# Altium integrated library Weidmueller_OMNIMATE_Signal.IntLib: 2550 symbols (part 3 of 45) (continued)
## 1032990000 (continued)
OMNIMATE Signal - series BC/SC 3.81; PartNumber: 1032990000; Manufacturer: Weidmueller; Short_text_for_material: SCDV 3.81/16/90F 3.2SN BK BX; Side_termination_characteristic: Flange; Mounting_onto_the_PCB: Solder connection; Pitch_mm: 3.81 mm; Pitch_inch: 0.15 inch; No_of_poles: 16; Outgoing_elbow: 90°; Solder_pin_length_mm: 3.2 mm; Contact_surface: tinned; Insulating_material: PA GF; UL_94_flammability_rating: V-0; Rated_voltage_for_surge_voltage_class_pollution_degree_II_2: 320 V; Rated_current_min_no_of_poles_TU_20_deg_C: 17.5 A; Rated_voltage_use_group_B_UL_1059: 300 V; Rated_current_use_group_B_UL_1059: 10 A; PackageReference: SCDV_3_81_90F_16; Colour: Black; Packaging: Box; Qty: 50 PCS; Revision: V1; ComponentLink1Description: Manufacturer URL; ComponentLink1URL: http://www.weidmueller.com/; ComponentLink2Description: URL Link1; ComponentLink2URL: http://catalog.weidmueller.com/catalog/Start.do?localeId=en&ObjectID=1032990000
footprint SCDV_3_81_90F_16 (OMNIMATE Signal - Serie BC/SC 3.81  SCDV 3.81/16/90F 3.2)
part A pins: A1, A2, A3, A4, A5, A6, A7, A8
part B pins: B1, B2, B3, B4, B5, B6, B7, B8

## 1032990000_Single
designator J?
OMNIMATE Signal - series BC/SC 3.81; PartNumber: 1032990000; Manufacturer: Weidmueller; Short_text_for_material: SCDV 3.81/16/90F 3.2SN BK BX; Side_termination_characteristic: Flange; Mounting_onto_the_PCB: Solder connection; Pitch_mm: 3.81 mm; Pitch_inch: 0.15 inch; No_of_poles: 16; Outgoing_elbow: 90°; Solder_pin_length_mm: 3.2 mm; Contact_surface: tinned; Insulating_material: PA GF; UL_94_flammability_rating: V-0; Rated_voltage_for_surge_voltage_class_pollution_degree_II_2: 320 V; Rated_current_min_no_of_poles_TU_20_deg_C: 17.5 A; Rated_voltage_use_group_B_UL_1059: 300 V; Rated_current_use_group_B_UL_1059: 10 A; PackageReference: SCDV_3_81_90F_16; Colour: Black; Packaging: Box; Qty: 50 PCS; Revision: V1; ComponentLink1Description: Manufacturer URL; ComponentLink1URL: http://www.weidmueller.com/; ComponentLink2Description: URL Link1; ComponentLink2URL: http://catalog.weidmueller.com/catalog/Start.do?localeId=en&ObjectID=1032990000
footprint SCDV_3_81_90F_16 (OMNIMATE Signal - Serie BC/SC 3.81  SCDV 3.81/16/90F 3.2)
part A pins: A1
part B pins: A2
part C pins: A3
part D pins: A4
part E pins: A5
part F pins: A6
part G pins: A7
part H pins: A8
part I pins: B1
part J pins: B2
part K pins: B3
part L pins: B4
part M pins: B5
part N pins: B6
part O pins: B7
part P pins: B8

## 1033490000
designator J?
OMNIMATE Signal - series BC/SC 3.81; PartNumber: 1033490000; Manufacturer: Weidmueller; Short_text_for_material: SCDV-THR 3.81/04/90G 3.2SN BK BX; Side_termination_characteristic: closed side; Mounting_onto_the_PCB: Reflow solder connection; Pitch_mm: 3.81 mm; Pitch_inch: 0.15 inch; No_of_poles: 4; Outgoing_elbow: 90°; Solder_pin_length_mm: 3.2 mm; Contact_material: Cu-Leg; Contact_surface: tinned; Insulating_material: LCP GF; UL_94_flammability_rating: V-0; Rated_voltage_for_surge_voltage_class_pollution_degree_II_2: 320 V; Rated_voltage_use_group_B_UL_1059: 300 V; Rated_current_use_group_B_UL_1059: 10 A; PackageReference: SCDV_THR_3_81_90G_04; Colour: Black; Packaging: Box; Qty: 50 PCS; Revision: V1; ComponentLink1Description: Manufacturer URL; ComponentLink1URL: http://www.weidmueller.com/; ComponentLink2Description: URL Link1; ComponentLink2URL: http://catalog.weidmueller.com/catalog/Start.do?localeId=en&ObjectID=1033490000
footprint SCDV_THR_3_81_90G_04 (OMNIMATE Signal - Serie BC/SC 3.81  SCDV-THR 3.81/04/90G 3.2)
part A pins: A1, A2
part B pins: B1, B2

## 1033490000_Single
designator J?
OMNIMATE Signal - series BC/SC 3.81; PartNumber: 1033490000; Manufacturer: Weidmueller; Short_text_for_material: SCDV-THR 3.81/04/90G 3.2SN BK BX; Side_termination_characteristic: closed side; Mounting_onto_the_PCB: Reflow solder connection; Pitch_mm: 3.81 mm; Pitch_inch: 0.15 inch; No_of_poles: 4; Outgoing_elbow: 90°; Solder_pin_length_mm: 3.2 mm; Contact_material: Cu-Leg; Contact_surface: tinned; Insulating_material: LCP GF; UL_94_flammability_rating: V-0; Rated_voltage_for_surge_voltage_class_pollution_degree_II_2: 320 V; Rated_voltage_use_group_B_UL_1059: 300 V; Rated_current_use_group_B_UL_1059: 10 A; PackageReference: SCDV_THR_3_81_90G_04; Colour: Black; Packaging: Box; Qty: 50 PCS; Revision: V1; ComponentLink1Description: Manufacturer URL; ComponentLink1URL: http://www.weidmueller.com/; ComponentLink2Description: URL Link1; ComponentLink2URL: http://catalog.weidmueller.com/catalog/Start.do?localeId=en&ObjectID=1033490000
footprint SCDV_THR_3_81_90G_04 (OMNIMATE Signal - Serie BC/SC 3.81  SCDV-THR 3.81/04/90G 3.2)
part A pins: A1
part B pins: A2
part C pins: B1
part D pins: B2

## 1033510000
designator J?
OMNIMATE Signal - series BC/SC 3.81; PartNumber: 1033510000; Manufacturer: Weidmueller; Short_text_for_material: SCDV-THR 3.81/06/90G 3.2SN BK BX; Side_termination_characteristic: closed side; Mounting_onto_the_PCB: Reflow solder connection; Pitch_mm: 3.81 mm; Pitch_inch: 0.15 inch; No_of_poles: 6; Outgoing_elbow: 90°; Solder_pin_length_mm: 3.2 mm; Contact_material: Cu-Leg; Contact_surface: tinned; Insulating_material: LCP GF; UL_94_flammability_rating: V-0; Rated_voltage_for_surge_voltage_class_pollution_degree_II_2: 320 V; Rated_voltage_use_group_B_UL_1059: 300 V; Rated_current_use_group_B_UL_1059: 10 A; PackageReference: SCDV_THR_3_81_90G_06; Colour: Black; Packaging: Box; Qty: 50 PCS; Revision: V1; ComponentLink1Description: Manufacturer URL; ComponentLink1URL: http://www.weidmueller.com/; ComponentLink2Description: URL Link1; ComponentLink2URL: http://catalog.weidmueller.com/catalog/Start.do?localeId=en&ObjectID=1033510000
footprint SCDV_THR_3_81_90G_06 (OMNIMATE Signal - Serie BC/SC 3.81  SCDV-THR 3.81/06/90G 3.2)
part A pins: A1, A2, A3
part B pins: B1, B2, B3

## 1033510000_Single
designator J?
OMNIMATE Signal - series BC/SC 3.81; PartNumber: 1033510000; Manufacturer: Weidmueller; Short_text_for_material: SCDV-THR 3.81/06/90G 3.2SN BK BX; Side_termination_characteristic: closed side; Mounting_onto_the_PCB: Reflow solder connection; Pitch_mm: 3.81 mm; Pitch_inch: 0.15 inch; No_of_poles: 6; Outgoing_elbow: 90°; Solder_pin_length_mm: 3.2 mm; Contact_material: Cu-Leg; Contact_surface: tinned; Insulating_material: LCP GF; UL_94_flammability_rating: V-0; Rated_voltage_for_surge_voltage_class_pollution_degree_II_2: 320 V; Rated_voltage_use_group_B_UL_1059: 300 V; Rated_current_use_group_B_UL_1059: 10 A; PackageReference: SCDV_THR_3_81_90G_06; Colour: Black; Packaging: Box; Qty: 50 PCS; Revision: V1; ComponentLink1Description: Manufacturer URL; ComponentLink1URL: http://www.weidmueller.com/; ComponentLink2Description: URL Link1; ComponentLink2URL: http://catalog.weidmueller.com/catalog/Start.do?localeId=en&ObjectID=1033510000
footprint SCDV_THR_3_81_90G_06 (OMNIMATE Signal - Serie BC/SC 3.81  SCDV-THR 3.81/06/90G 3.2)
part A pins: A1
part B pins: A2
part C pins: A3
part D pins: B1
part E pins: B2
part F pins: B3

## 1033520000
designator J?
OMNIMATE Signal - series BC/SC 3.81; PartNumber: 1033520000; Manufacturer: Weidmueller; Short_text_for_material: SCDV-THR 3.81/08/90G 3.2SN BK BX; Side_termination_characteristic: closed side; Mounting_onto_the_PCB: Reflow solder connection; Pitch_mm: 3.81 mm; Pitch_inch: 0.15 inch; No_of_poles: 8; Outgoing_elbow: 90°; Solder_pin_length_mm: 3.2 mm; Contact_material: Cu-Leg; Contact_surface: tinned; Insulating_material: LCP GF; UL_94_flammability_rating: V-0; Rated_voltage_for_surge_voltage_class_pollution_degree_II_2: 320 V; Rated_voltage_use_group_B_UL_1059: 300 V; Rated_current_use_group_B_UL_1059: 10 A; PackageReference: SCDV_THR_3_81_90G_08; Colour: Black; Packaging: Box; Qty: 50 PCS; Revision: V1; ComponentLink1Description: Manufacturer URL; ComponentLink1URL: http://www.weidmueller.com/; ComponentLink2Description: URL Link1; ComponentLink2URL: http://catalog.weidmueller.com/catalog/Start.do?localeId=en&ObjectID=1033520000
footprint SCDV_THR_3_81_90G_08 (OMNIMATE Signal - Serie BC/SC 3.81  SCDV-THR 3.81/08/90G 3.2)
part A pins: A1, A2, A3, A4
part B pins: B1, B2, B3, B4

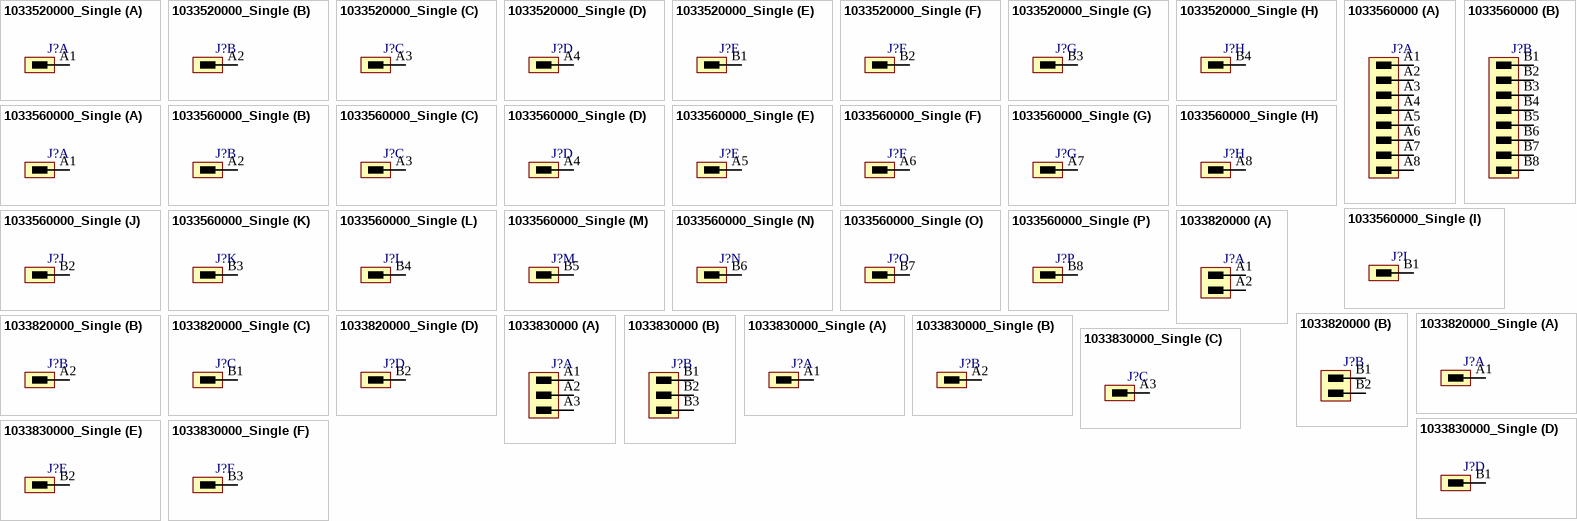
[diagram p16: symbols 1033520000_Single to 1033830000_Single]

## 1033520000_Single
designator J?
OMNIMATE Signal - series BC/SC 3.81; PartNumber: 1033520000; Manufacturer: Weidmueller; Short_text_for_material: SCDV-THR 3.81/08/90G 3.2SN BK BX; Side_termination_characteristic: closed side; Mounting_onto_the_PCB: Reflow solder connection; Pitch_mm: 3.81 mm; Pitch_inch: 0.15 inch; No_of_poles: 8; Outgoing_elbow: 90°; Solder_pin_length_mm: 3.2 mm; Contact_material: Cu-Leg; Contact_surface: tinned; Insulating_material: LCP GF; UL_94_flammability_rating: V-0; Rated_voltage_for_surge_voltage_class_pollution_degree_II_2: 320 V; Rated_voltage_use_group_B_UL_1059: 300 V; Rated_current_use_group_B_UL_1059: 10 A; PackageReference: SCDV_THR_3_81_90G_08; Colour: Black; Packaging: Box; Qty: 50 PCS; Revision: V1; ComponentLink1Description: Manufacturer URL; ComponentLink1URL: http://www.weidmueller.com/; ComponentLink2Description: URL Link1; ComponentLink2URL: http://catalog.weidmueller.com/catalog/Start.do?localeId=en&ObjectID=1033520000
footprint SCDV_THR_3_81_90G_08 (OMNIMATE Signal - Serie BC/SC 3.81  SCDV-THR 3.81/08/90G 3.2)
part A pins: A1
part B pins: A2
part C pins: A3
part D pins: A4
part E pins: B1
part F pins: B2
part G pins: B3
part H pins: B4

## 1033560000
designator J?
OMNIMATE Signal - series BC/SC 3.81; PartNumber: 1033560000; Manufacturer: Weidmueller; Short_text_for_material: SCDV-THR 3.81/16/90G 3.2SN BK BX; Side_termination_characteristic: closed side; Mounting_onto_the_PCB: Reflow solder connection; Pitch_mm: 3.81 mm; Pitch_inch: 0.15 inch; No_of_poles: 16; Outgoing_elbow: 90°; Solder_pin_length_mm: 3.2 mm; Contact_material: Cu-Leg; Contact_surface: tinned; Insulating_material: LCP GF; UL_94_flammability_rating: V-0; Rated_voltage_for_surge_voltage_class_pollution_degree_II_2: 320 V; Rated_voltage_use_group_B_UL_1059: 300 V; Rated_current_use_group_B_UL_1059: 10 A; PackageReference: SCDV_THR_3_81_90G_16; Colour: Black; Packaging: Box; Qty: 50 PCS; Revision: V1; ComponentLink1Description: Manufacturer URL; ComponentLink1URL: http://www.weidmueller.com/; ComponentLink2Description: URL Link1; ComponentLink2URL: http://catalog.weidmueller.com/catalog/Start.do?localeId=en&ObjectID=1033560000
footprint SCDV_THR_3_81_90G_16 (OMNIMATE Signal - Serie BC/SC 3.81  SCDV-THR 3.81/16/90G 3.2)
part A pins: A1, A2, A3, A4, A5, A6, A7, A8
part B pins: B1, B2, B3, B4, B5, B6, B7, B8

## 1033560000_Single
designator J?
OMNIMATE Signal - series BC/SC 3.81; PartNumber: 1033560000; Manufacturer: Weidmueller; Short_text_for_material: SCDV-THR 3.81/16/90G 3.2SN BK BX; Side_termination_characteristic: closed side; Mounting_onto_the_PCB: Reflow solder connection; Pitch_mm: 3.81 mm; Pitch_inch: 0.15 inch; No_of_poles: 16; Outgoing_elbow: 90°; Solder_pin_length_mm: 3.2 mm; Contact_material: Cu-Leg; Contact_surface: tinned; Insulating_material: LCP GF; UL_94_flammability_rating: V-0; Rated_voltage_for_surge_voltage_class_pollution_degree_II_2: 320 V; Rated_voltage_use_group_B_UL_1059: 300 V; Rated_current_use_group_B_UL_1059: 10 A; PackageReference: SCDV_THR_3_81_90G_16; Colour: Black; Packaging: Box; Qty: 50 PCS; Revision: V1; ComponentLink1Description: Manufacturer URL; ComponentLink1URL: http://www.weidmueller.com/; ComponentLink2Description: URL Link1; ComponentLink2URL: http://catalog.weidmueller.com/catalog/Start.do?localeId=en&ObjectID=1033560000
footprint SCDV_THR_3_81_90G_16 (OMNIMATE Signal - Serie BC/SC 3.81  SCDV-THR 3.81/16/90G 3.2)
part A pins: A1
part B pins: A2
part C pins: A3
part D pins: A4
part E pins: A5
part F pins: A6
part G pins: A7
part H pins: A8
part I pins: B1
part J pins: B2
part K pins: B3
part L pins: B4
part M pins: B5
part N pins: B6
part O pins: B7
part P pins: B8

## 1033820000
designator J?
OMNIMATE Signal - series BC/SC 3.81; PartNumber: 1033820000; Manufacturer: Weidmueller; Short_text_for_material: SCDV-THR 3.81/04/90G 1.5SN BK BX; Side_termination_characteristic: closed side; Mounting_onto_the_PCB: Reflow solder connection; Pitch_mm: 3.81 mm; Pitch_inch: 0.15 inch; No_of_poles: 4; Outgoing_elbow: 90°; Solder_pin_length_mm: 1.5 mm; Contact_surface: tinned; Insulating_material: LCP GF; UL_94_flammability_rating: V-0; Rated_voltage_for_surge_voltage_class_pollution_degree_II_2: 320 V; Rated_current_min_no_of_poles_TU_20_deg_C: 17.5 A; Rated_voltage_use_group_B_UL_1059: 300 V; Rated_current_use_group_B_UL_1059: 10 A; PackageReference: SCDV_THR_3_81_90G_04; Colour: Black; Packaging: Box; Qty: 50 PCS; Revision: V1; ComponentLink1Description: Manufacturer URL; ComponentLink1URL: http://www.weidmueller.com/; ComponentLink2Description: URL Link1; ComponentLink2URL: http://catalog.weidmueller.com/catalog/Start.do?localeId=en&ObjectID=1033820000
footprint SCDV_THR_3_81_90G_04 (OMNIMATE Signal - Serie BC/SC 3.81  SCDV-THR 3.81/04/90G 3.2)
part A pins: A1, A2
part B pins: B1, B2

## 1033820000_Single
designator J?
OMNIMATE Signal - series BC/SC 3.81; PartNumber: 1033820000; Manufacturer: Weidmueller; Short_text_for_material: SCDV-THR 3.81/04/90G 1.5SN BK BX; Side_termination_characteristic: closed side; Mounting_onto_the_PCB: Reflow solder connection; Pitch_mm: 3.81 mm; Pitch_inch: 0.15 inch; No_of_poles: 4; Outgoing_elbow: 90°; Solder_pin_length_mm: 1.5 mm; Contact_surface: tinned; Insulating_material: LCP GF; UL_94_flammability_rating: V-0; Rated_voltage_for_surge_voltage_class_pollution_degree_II_2: 320 V; Rated_current_min_no_of_poles_TU_20_deg_C: 17.5 A; Rated_voltage_use_group_B_UL_1059: 300 V; Rated_current_use_group_B_UL_1059: 10 A; PackageReference: SCDV_THR_3_81_90G_04; Colour: Black; Packaging: Box; Qty: 50 PCS; Revision: V1; ComponentLink1Description: Manufacturer URL; ComponentLink1URL: http://www.weidmueller.com/; ComponentLink2Description: URL Link1; ComponentLink2URL: http://catalog.weidmueller.com/catalog/Start.do?localeId=en&ObjectID=1033820000
footprint SCDV_THR_3_81_90G_04 (OMNIMATE Signal - Serie BC/SC 3.81  SCDV-THR 3.81/04/90G 3.2)
part A pins: A1
part B pins: A2
part C pins: B1
part D pins: B2

## 1033830000
designator J?
OMNIMATE Signal - series BC/SC 3.81; PartNumber: 1033830000; Manufacturer: Weidmueller; Short_text_for_material: SCDV-THR 3.81/06/90G 1.5SN BK BX; Side_termination_characteristic: closed side; Mounting_onto_the_PCB: Reflow solder connection; Pitch_mm: 3.81 mm; Pitch_inch: 0.15 inch; No_of_poles: 6; Outgoing_elbow: 90°; Solder_pin_length_mm: 1.5 mm; Contact_surface: tinned; Insulating_material: LCP GF; UL_94_flammability_rating: V-0; Rated_voltage_for_surge_voltage_class_pollution_degree_II_2: 320 V; Rated_current_min_no_of_poles_TU_20_deg_C: 17.5 A; Rated_voltage_use_group_B_UL_1059: 300 V; Rated_current_use_group_B_UL_1059: 10 A; PackageReference: SCDV_THR_3_81_90G_06; Colour: Black; Packaging: Box; Qty: 50 PCS; Revision: V1; ComponentLink1Description: Manufacturer URL; ComponentLink1URL: http://www.weidmueller.com/; ComponentLink2Description: URL Link1; ComponentLink2URL: http://catalog.weidmueller.com/catalog/Start.do?localeId=en&ObjectID=1033830000
footprint SCDV_THR_3_81_90G_06 (OMNIMATE Signal - Serie BC/SC 3.81  SCDV-THR 3.81/06/90G 3.2)
part A pins: A1, A2, A3
part B pins: B1, B2, B3

## 1033830000_Single
designator J?
OMNIMATE Signal - series BC/SC 3.81; PartNumber: 1033830000; Manufacturer: Weidmueller; Short_text_for_material: SCDV-THR 3.81/06/90G 1.5SN BK BX; Side_termination_characteristic: closed side; Mounting_onto_the_PCB: Reflow solder connection; Pitch_mm: 3.81 mm; Pitch_inch: 0.15 inch; No_of_poles: 6; Outgoing_elbow: 90°; Solder_pin_length_mm: 1.5 mm; Contact_surface: tinned; Insulating_material: LCP GF; UL_94_flammability_rating: V-0; Rated_voltage_for_surge_voltage_class_pollution_degree_II_2: 320 V; Rated_current_min_no_of_poles_TU_20_deg_C: 17.5 A; Rated_voltage_use_group_B_UL_1059: 300 V; Rated_current_use_group_B_UL_1059: 10 A; PackageReference: SCDV_THR_3_81_90G_06; Colour: Black; Packaging: Box; Qty: 50 PCS; Revision: V1; ComponentLink1Description: Manufacturer URL; ComponentLink1URL: http://www.weidmueller.com/; ComponentLink2Description: URL Link1; ComponentLink2URL: http://catalog.weidmueller.com/catalog/Start.do?localeId=en&ObjectID=1033830000
footprint SCDV_THR_3_81_90G_06 (OMNIMATE Signal - Serie BC/SC 3.81  SCDV-THR 3.81/06/90G 3.2)
part A pins: A1
part B pins: A2
part C pins: A3
part D pins: B1
part E pins: B2
part F pins: B3

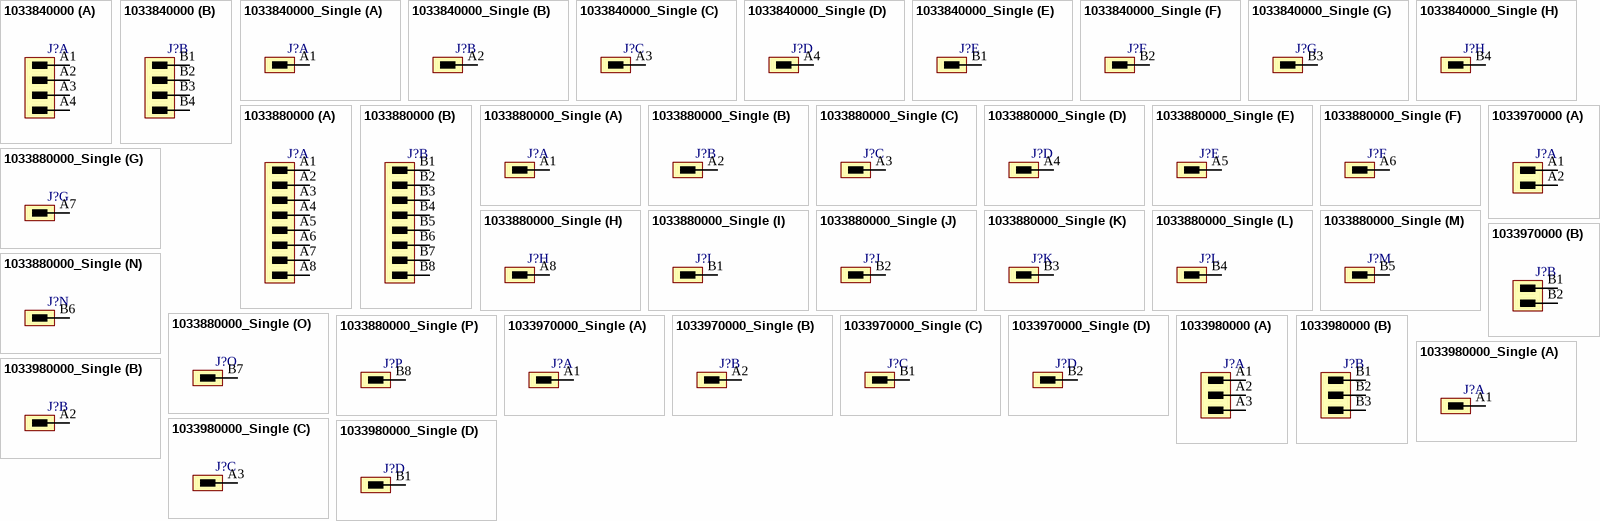
[diagram p17: symbols 1033840000 to 1033980000_Single]

## 1033840000
designator J?
OMNIMATE Signal - series BC/SC 3.81; PartNumber: 1033840000; Manufacturer: Weidmueller; Short_text_for_material: SCDV-THR 3.81/08/90G 1.5SN BK BX; Side_termination_characteristic: closed side; Mounting_onto_the_PCB: Reflow solder connection; Pitch_mm: 3.81 mm; Pitch_inch: 0.15 inch; No_of_poles: 8; Outgoing_elbow: 90°; Solder_pin_length_mm: 1.5 mm; Contact_surface: tinned; Insulating_material: LCP GF; UL_94_flammability_rating: V-0; Rated_voltage_for_surge_voltage_class_pollution_degree_II_2: 320 V; Rated_current_min_no_of_poles_TU_20_deg_C: 17.5 A; Rated_voltage_use_group_B_UL_1059: 300 V; Rated_current_use_group_B_UL_1059: 10 A; PackageReference: SCDV_THR_3_81_90G_08; Colour: Black; Packaging: Box; Qty: 50 PCS; Revision: V1; ComponentLink1Description: Manufacturer URL; ComponentLink1URL: http://www.weidmueller.com/; ComponentLink2Description: URL Link1; ComponentLink2URL: http://catalog.weidmueller.com/catalog/Start.do?localeId=en&ObjectID=1033840000
footprint SCDV_THR_3_81_90G_08 (OMNIMATE Signal - Serie BC/SC 3.81  SCDV-THR 3.81/08/90G 3.2)
part A pins: A1, A2, A3, A4
part B pins: B1, B2, B3, B4

## 1033840000_Single
designator J?
OMNIMATE Signal - series BC/SC 3.81; PartNumber: 1033840000; Manufacturer: Weidmueller; Short_text_for_material: SCDV-THR 3.81/08/90G 1.5SN BK BX; Side_termination_characteristic: closed side; Mounting_onto_the_PCB: Reflow solder connection; Pitch_mm: 3.81 mm; Pitch_inch: 0.15 inch; No_of_poles: 8; Outgoing_elbow: 90°; Solder_pin_length_mm: 1.5 mm; Contact_surface: tinned; Insulating_material: LCP GF; UL_94_flammability_rating: V-0; Rated_voltage_for_surge_voltage_class_pollution_degree_II_2: 320 V; Rated_current_min_no_of_poles_TU_20_deg_C: 17.5 A; Rated_voltage_use_group_B_UL_1059: 300 V; Rated_current_use_group_B_UL_1059: 10 A; PackageReference: SCDV_THR_3_81_90G_08; Colour: Black; Packaging: Box; Qty: 50 PCS; Revision: V1; ComponentLink1Description: Manufacturer URL; ComponentLink1URL: http://www.weidmueller.com/; ComponentLink2Description: URL Link1; ComponentLink2URL: http://catalog.weidmueller.com/catalog/Start.do?localeId=en&ObjectID=1033840000
footprint SCDV_THR_3_81_90G_08 (OMNIMATE Signal - Serie BC/SC 3.81  SCDV-THR 3.81/08/90G 3.2)
part A pins: A1
part B pins: A2
part C pins: A3
part D pins: A4
part E pins: B1
part F pins: B2
part G pins: B3
part H pins: B4

## 1033880000
designator J?
OMNIMATE Signal - series BC/SC 3.81; PartNumber: 1033880000; Manufacturer: Weidmueller; Short_text_for_material: SCDV-THR 3.81/16/90G 1.5SN BK BX; Side_termination_characteristic: closed side; Mounting_onto_the_PCB: Reflow solder connection; Pitch_mm: 3.81 mm; Pitch_inch: 0.15 inch; No_of_poles: 16; Outgoing_elbow: 90°; Solder_pin_length_mm: 1.5 mm; Contact_surface: tinned; Insulating_material: LCP GF; UL_94_flammability_rating: V-0; Rated_voltage_for_surge_voltage_class_pollution_degree_II_2: 320 V; Rated_current_min_no_of_poles_TU_20_deg_C: 17.5 A; Rated_voltage_use_group_B_UL_1059: 300 V; Rated_current_use_group_B_UL_1059: 10 A; PackageReference: SCDV_THR_3_81_90G_16; Colour: Black; Packaging: Box; Qty: 50 PCS; Revision: V1; ComponentLink1Description: Manufacturer URL; ComponentLink1URL: http://www.weidmueller.com/; ComponentLink2Description: URL Link1; ComponentLink2URL: http://catalog.weidmueller.com/catalog/Start.do?localeId=en&ObjectID=1033880000
footprint SCDV_THR_3_81_90G_16 (OMNIMATE Signal - Serie BC/SC 3.81  SCDV-THR 3.81/16/90G 3.2)
part A pins: A1, A2, A3, A4, A5, A6, A7, A8
part B pins: B1, B2, B3, B4, B5, B6, B7, B8

## 1033880000_Single
designator J?
OMNIMATE Signal - series BC/SC 3.81; PartNumber: 1033880000; Manufacturer: Weidmueller; Short_text_for_material: SCDV-THR 3.81/16/90G 1.5SN BK BX; Side_termination_characteristic: closed side; Mounting_onto_the_PCB: Reflow solder connection; Pitch_mm: 3.81 mm; Pitch_inch: 0.15 inch; No_of_poles: 16; Outgoing_elbow: 90°; Solder_pin_length_mm: 1.5 mm; Contact_surface: tinned; Insulating_material: LCP GF; UL_94_flammability_rating: V-0; Rated_voltage_for_surge_voltage_class_pollution_degree_II_2: 320 V; Rated_current_min_no_of_poles_TU_20_deg_C: 17.5 A; Rated_voltage_use_group_B_UL_1059: 300 V; Rated_current_use_group_B_UL_1059: 10 A; PackageReference: SCDV_THR_3_81_90G_16; Colour: Black; Packaging: Box; Qty: 50 PCS; Revision: V1; ComponentLink1Description: Manufacturer URL; ComponentLink1URL: http://www.weidmueller.com/; ComponentLink2Description: URL Link1; ComponentLink2URL: http://catalog.weidmueller.com/catalog/Start.do?localeId=en&ObjectID=1033880000
footprint SCDV_THR_3_81_90G_16 (OMNIMATE Signal - Serie BC/SC 3.81  SCDV-THR 3.81/16/90G 3.2)
part A pins: A1
part B pins: A2
part C pins: A3
part D pins: A4
part E pins: A5
part F pins: A6
part G pins: A7
part H pins: A8
part I pins: B1
part J pins: B2
part K pins: B3
part L pins: B4
part M pins: B5
part N pins: B6
part O pins: B7
part P pins: B8

## 1033970000
designator J?
OMNIMATE Signal - series BC/SC 3.81; PartNumber: 1033970000; Manufacturer: Weidmueller; Short_text_for_material: SCDV-THR 3.81/04/90F 3.2SN BK BX; Side_termination_characteristic: Flange; Mounting_onto_the_PCB: Reflow solder connection; Pitch_mm: 3.81 mm; Pitch_inch: 0.15 inch; No_of_poles: 4; Outgoing_elbow: 90°; Solder_pin_length_mm: 3.2 mm; Contact_material: Cu-Leg; Contact_surface: tinned; Insulating_material: LCP GF; UL_94_flammability_rating: V-0; Rated_voltage_for_surge_voltage_class_pollution_degree_II_2: 320 V; Rated_voltage_use_group_B_UL_1059: 300 V; Rated_current_use_group_B_UL_1059: 10 A; PackageReference: SCDV_THR_3_81_90F_04; Colour: Black; Packaging: Box; Qty: 50 PCS; Revision: V1; ComponentLink1Description: Manufacturer URL; ComponentLink1URL: http://www.weidmueller.com/; ComponentLink2Description: URL Link1; ComponentLink2URL: http://catalog.weidmueller.com/catalog/Start.do?localeId=en&ObjectID=1033970000
footprint SCDV_THR_3_81_90F_04 (OMNIMATE Signal - Serie BC/SC 3.81  SCDV-THR 3.81/04/90F 3.2)
part A pins: A1, A2
part B pins: B1, B2

## 1033970000_Single
designator J?
OMNIMATE Signal - series BC/SC 3.81; PartNumber: 1033970000; Manufacturer: Weidmueller; Short_text_for_material: SCDV-THR 3.81/04/90F 3.2SN BK BX; Side_termination_characteristic: Flange; Mounting_onto_the_PCB: Reflow solder connection; Pitch_mm: 3.81 mm; Pitch_inch: 0.15 inch; No_of_poles: 4; Outgoing_elbow: 90°; Solder_pin_length_mm: 3.2 mm; Contact_material: Cu-Leg; Contact_surface: tinned; Insulating_material: LCP GF; UL_94_flammability_rating: V-0; Rated_voltage_for_surge_voltage_class_pollution_degree_II_2: 320 V; Rated_voltage_use_group_B_UL_1059: 300 V; Rated_current_use_group_B_UL_1059: 10 A; PackageReference: SCDV_THR_3_81_90F_04; Colour: Black; Packaging: Box; Qty: 50 PCS; Revision: V1; ComponentLink1Description: Manufacturer URL; ComponentLink1URL: http://www.weidmueller.com/; ComponentLink2Description: URL Link1; ComponentLink2URL: http://catalog.weidmueller.com/catalog/Start.do?localeId=en&ObjectID=1033970000
footprint SCDV_THR_3_81_90F_04 (OMNIMATE Signal - Serie BC/SC 3.81  SCDV-THR 3.81/04/90F 3.2)
part A pins: A1
part B pins: A2
part C pins: B1
part D pins: B2

## 1033980000
designator J?
OMNIMATE Signal - series BC/SC 3.81; PartNumber: 1033980000; Manufacturer: Weidmueller; Short_text_for_material: SCDV-THR 3.81/06/90F 3.2SN BK BX; Side_termination_characteristic: Flange; Mounting_onto_the_PCB: Reflow solder connection; Pitch_mm: 3.81 mm; Pitch_inch: 0.15 inch; No_of_poles: 6; Outgoing_elbow: 90°; Solder_pin_length_mm: 3.2 mm; Contact_material: Cu-Leg; Contact_surface: tinned; Insulating_material: LCP GF; UL_94_flammability_rating: V-0; Rated_voltage_for_surge_voltage_class_pollution_degree_II_2: 320 V; Rated_voltage_use_group_B_UL_1059: 300 V; Rated_current_use_group_B_UL_1059: 10 A; PackageReference: SCDV_THR_3_81_90F_06; Colour: Black; Packaging: Box; Qty: 50 PCS; Revision: V1; ComponentLink1Description: Manufacturer URL; ComponentLink1URL: http://www.weidmueller.com/; ComponentLink2Description: URL Link1; ComponentLink2URL: http://catalog.weidmueller.com/catalog/Start.do?localeId=en&ObjectID=1033980000
footprint SCDV_THR_3_81_90F_06 (OMNIMATE Signal - Serie BC/SC 3.81  SCDV-THR 3.81/06/90F 3.2)
part A pins: A1, A2, A3
part B pins: B1, B2, B3

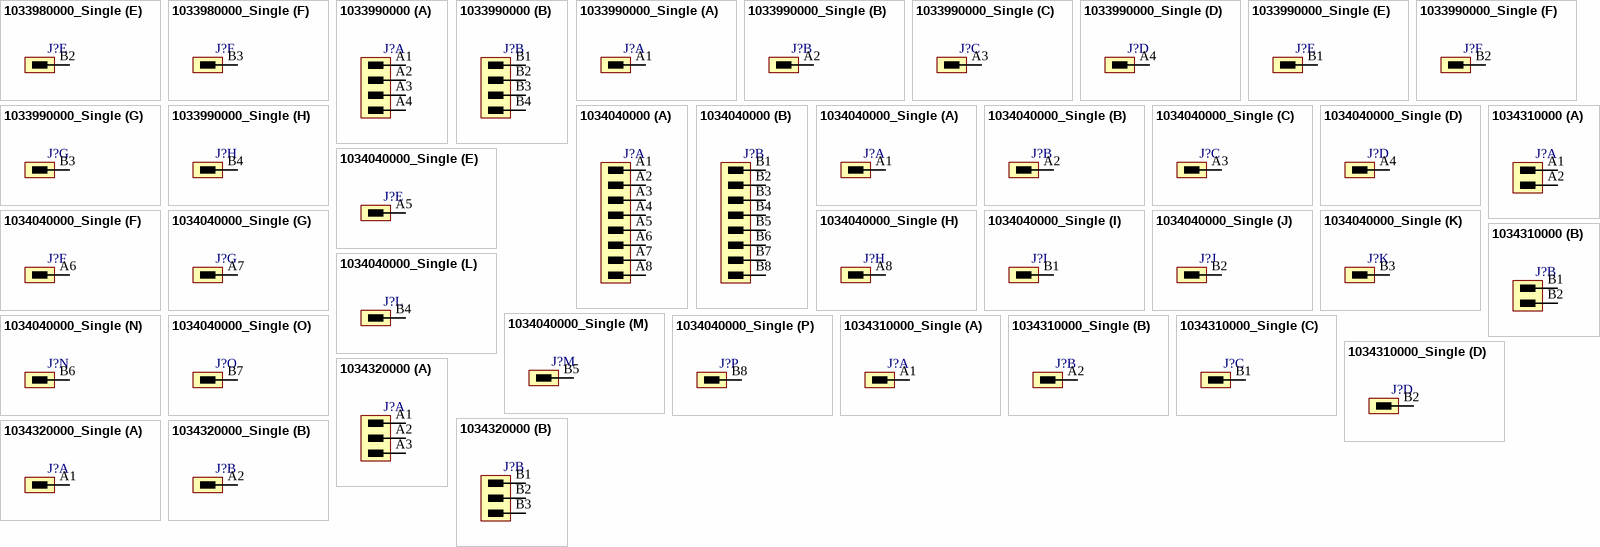
[diagram p18: symbols 1033980000_Single to 1034320000_Single]

## 1033980000_Single
designator J?
OMNIMATE Signal - series BC/SC 3.81; PartNumber: 1033980000; Manufacturer: Weidmueller; Short_text_for_material: SCDV-THR 3.81/06/90F 3.2SN BK BX; Side_termination_characteristic: Flange; Mounting_onto_the_PCB: Reflow solder connection; Pitch_mm: 3.81 mm; Pitch_inch: 0.15 inch; No_of_poles: 6; Outgoing_elbow: 90°; Solder_pin_length_mm: 3.2 mm; Contact_material: Cu-Leg; Contact_surface: tinned; Insulating_material: LCP GF; UL_94_flammability_rating: V-0; Rated_voltage_for_surge_voltage_class_pollution_degree_II_2: 320 V; Rated_voltage_use_group_B_UL_1059: 300 V; Rated_current_use_group_B_UL_1059: 10 A; PackageReference: SCDV_THR_3_81_90F_06; Colour: Black; Packaging: Box; Qty: 50 PCS; Revision: V1; ComponentLink1Description: Manufacturer URL; ComponentLink1URL: http://www.weidmueller.com/; ComponentLink2Description: URL Link1; ComponentLink2URL: http://catalog.weidmueller.com/catalog/Start.do?localeId=en&ObjectID=1033980000
footprint SCDV_THR_3_81_90F_06 (OMNIMATE Signal - Serie BC/SC 3.81  SCDV-THR 3.81/06/90F 3.2)
part A pins: A1
part B pins: A2
part C pins: A3
part D pins: B1
part E pins: B2
part F pins: B3

## 1033990000
designator J?
OMNIMATE Signal - series BC/SC 3.81; PartNumber: 1033990000; Manufacturer: Weidmueller; Short_text_for_material: SCDV-THR 3.81/08/90F 3.2SN BK BX; Side_termination_characteristic: Flange; Mounting_onto_the_PCB: Reflow solder connection; Pitch_mm: 3.81 mm; Pitch_inch: 0.15 inch; No_of_poles: 8; Outgoing_elbow: 90°; Solder_pin_length_mm: 3.2 mm; Contact_material: Cu-Leg; Contact_surface: tinned; Insulating_material: LCP GF; UL_94_flammability_rating: V-0; Rated_voltage_for_surge_voltage_class_pollution_degree_II_2: 320 V; Rated_voltage_use_group_B_UL_1059: 300 V; Rated_current_use_group_B_UL_1059: 10 A; PackageReference: SCDV_THR_3_81_90F_08; Colour: Black; Packaging: Box; Qty: 50 PCS; Revision: V1; ComponentLink1Description: Manufacturer URL; ComponentLink1URL: http://www.weidmueller.com/; ComponentLink2Description: URL Link1; ComponentLink2URL: http://catalog.weidmueller.com/catalog/Start.do?localeId=en&ObjectID=1033990000
footprint SCDV_THR_3_81_90F_08 (OMNIMATE Signal - Serie BC/SC 3.81  SCDV-THR 3.81/08/90F 3.2)
part A pins: A1, A2, A3, A4
part B pins: B1, B2, B3, B4

## 1033990000_Single
designator J?
OMNIMATE Signal - series BC/SC 3.81; PartNumber: 1033990000; Manufacturer: Weidmueller; Short_text_for_material: SCDV-THR 3.81/08/90F 3.2SN BK BX; Side_termination_characteristic: Flange; Mounting_onto_the_PCB: Reflow solder connection; Pitch_mm: 3.81 mm; Pitch_inch: 0.15 inch; No_of_poles: 8; Outgoing_elbow: 90°; Solder_pin_length_mm: 3.2 mm; Contact_material: Cu-Leg; Contact_surface: tinned; Insulating_material: LCP GF; UL_94_flammability_rating: V-0; Rated_voltage_for_surge_voltage_class_pollution_degree_II_2: 320 V; Rated_voltage_use_group_B_UL_1059: 300 V; Rated_current_use_group_B_UL_1059: 10 A; PackageReference: SCDV_THR_3_81_90F_08; Colour: Black; Packaging: Box; Qty: 50 PCS; Revision: V1; ComponentLink1Description: Manufacturer URL; ComponentLink1URL: http://www.weidmueller.com/; ComponentLink2Description: URL Link1; ComponentLink2URL: http://catalog.weidmueller.com/catalog/Start.do?localeId=en&ObjectID=1033990000
footprint SCDV_THR_3_81_90F_08 (OMNIMATE Signal - Serie BC/SC 3.81  SCDV-THR 3.81/08/90F 3.2)
part A pins: A1
part B pins: A2
part C pins: A3
part D pins: A4
part E pins: B1
part F pins: B2
part G pins: B3
part H pins: B4

## 1034040000
designator J?
OMNIMATE Signal - series BC/SC 3.81; PartNumber: 1034040000; Manufacturer: Weidmueller; Short_text_for_material: SCDV-THR 3.81/16/90F 3.2SN BK BX; Side_termination_characteristic: Flange; Mounting_onto_the_PCB: Reflow solder connection; Pitch_mm: 3.81 mm; Pitch_inch: 0.15 inch; No_of_poles: 16; Outgoing_elbow: 90°; Solder_pin_length_mm: 3.2 mm; Contact_material: Cu-Leg; Contact_surface: tinned; Insulating_material: LCP GF; UL_94_flammability_rating: V-0; Rated_voltage_for_surge_voltage_class_pollution_degree_II_2: 320 V; Rated_voltage_use_group_B_UL_1059: 300 V; Rated_current_use_group_B_UL_1059: 10 A; PackageReference: SCDV_THR_3_81_90F_16; Colour: Black; Packaging: Box; Qty: 50 PCS; Revision: V1; ComponentLink1Description: Manufacturer URL; ComponentLink1URL: http://www.weidmueller.com/; ComponentLink2Description: URL Link1; ComponentLink2URL: http://catalog.weidmueller.com/catalog/Start.do?localeId=en&ObjectID=1034040000
footprint SCDV_THR_3_81_90F_16 (OMNIMATE Signal - Serie BC/SC 3.81  SCDV-THR 3.81/16/90F 3.2)
part A pins: A1, A2, A3, A4, A5, A6, A7, A8
part B pins: B1, B2, B3, B4, B5, B6, B7, B8

## 1034040000_Single
designator J?
OMNIMATE Signal - series BC/SC 3.81; PartNumber: 1034040000; Manufacturer: Weidmueller; Short_text_for_material: SCDV-THR 3.81/16/90F 3.2SN BK BX; Side_termination_characteristic: Flange; Mounting_onto_the_PCB: Reflow solder connection; Pitch_mm: 3.81 mm; Pitch_inch: 0.15 inch; No_of_poles: 16; Outgoing_elbow: 90°; Solder_pin_length_mm: 3.2 mm; Contact_material: Cu-Leg; Contact_surface: tinned; Insulating_material: LCP GF; UL_94_flammability_rating: V-0; Rated_voltage_for_surge_voltage_class_pollution_degree_II_2: 320 V; Rated_voltage_use_group_B_UL_1059: 300 V; Rated_current_use_group_B_UL_1059: 10 A; PackageReference: SCDV_THR_3_81_90F_16; Colour: Black; Packaging: Box; Qty: 50 PCS; Revision: V1; ComponentLink1Description: Manufacturer URL; ComponentLink1URL: http://www.weidmueller.com/; ComponentLink2Description: URL Link1; ComponentLink2URL: http://catalog.weidmueller.com/catalog/Start.do?localeId=en&ObjectID=1034040000
footprint SCDV_THR_3_81_90F_16 (OMNIMATE Signal - Serie BC/SC 3.81  SCDV-THR 3.81/16/90F 3.2)
part A pins: A1
part B pins: A2
part C pins: A3
part D pins: A4
part E pins: A5
part F pins: A6
part G pins: A7
part H pins: A8
part I pins: B1
part J pins: B2
part K pins: B3
part L pins: B4
part M pins: B5
part N pins: B6
part O pins: B7
part P pins: B8

## 1034310000
designator J?
OMNIMATE Signal - series BC/SC 3.81; PartNumber: 1034310000; Manufacturer: Weidmueller; Short_text_for_material: SCDV-THR 3.81/04/90F 1.5SN BK BX; Side_termination_characteristic: Flange; Mounting_onto_the_PCB: Reflow solder connection; Pitch_mm: 3.81 mm; Pitch_inch: 0.15 inch; No_of_poles: 4; Outgoing_elbow: 90°; Solder_pin_length_mm: 1.5 mm; Contact_surface: tinned; Insulating_material: LCP GF; UL_94_flammability_rating: V-0; Rated_voltage_for_surge_voltage_class_pollution_degree_II_2: 320 V; Rated_current_min_no_of_poles_TU_20_deg_C: 17.5 A; Rated_voltage_use_group_B_UL_1059: 300 V; Rated_current_use_group_B_UL_1059: 10 A; PackageReference: SCDV_THR_3_81_90F_04; Colour: Black; Packaging: Box; Qty: 50 PCS; Revision: V1; ComponentLink1Description: Manufacturer URL; ComponentLink1URL: http://www.weidmueller.com/; ComponentLink2Description: URL Link1; ComponentLink2URL: http://catalog.weidmueller.com/catalog/Start.do?localeId=en&ObjectID=1034310000
footprint SCDV_THR_3_81_90F_04 (OMNIMATE Signal - Serie BC/SC 3.81  SCDV-THR 3.81/04/90F 3.2)
part A pins: A1, A2
part B pins: B1, B2

## 1034310000_Single
designator J?
OMNIMATE Signal - series BC/SC 3.81; PartNumber: 1034310000; Manufacturer: Weidmueller; Short_text_for_material: SCDV-THR 3.81/04/90F 1.5SN BK BX; Side_termination_characteristic: Flange; Mounting_onto_the_PCB: Reflow solder connection; Pitch_mm: 3.81 mm; Pitch_inch: 0.15 inch; No_of_poles: 4; Outgoing_elbow: 90°; Solder_pin_length_mm: 1.5 mm; Contact_surface: tinned; Insulating_material: LCP GF; UL_94_flammability_rating: V-0; Rated_voltage_for_surge_voltage_class_pollution_degree_II_2: 320 V; Rated_current_min_no_of_poles_TU_20_deg_C: 17.5 A; Rated_voltage_use_group_B_UL_1059: 300 V; Rated_current_use_group_B_UL_1059: 10 A; PackageReference: SCDV_THR_3_81_90F_04; Colour: Black; Packaging: Box; Qty: 50 PCS; Revision: V1; ComponentLink1Description: Manufacturer URL; ComponentLink1URL: http://www.weidmueller.com/; ComponentLink2Description: URL Link1; ComponentLink2URL: http://catalog.weidmueller.com/catalog/Start.do?localeId=en&ObjectID=1034310000
footprint SCDV_THR_3_81_90F_04 (OMNIMATE Signal - Serie BC/SC 3.81  SCDV-THR 3.81/04/90F 3.2)
part A pins: A1
part B pins: A2
part C pins: B1
part D pins: B2

## 1034320000
designator J?
OMNIMATE Signal - series BC/SC 3.81; PartNumber: 1034320000; Manufacturer: Weidmueller; Short_text_for_material: SCDV-THR 3.81/06/90F 1.5SN BK BX; Side_termination_characteristic: Flange; Mounting_onto_the_PCB: Reflow solder connection; Pitch_mm: 3.81 mm; Pitch_inch: 0.15 inch; No_of_poles: 6; Outgoing_elbow: 90°; Solder_pin_length_mm: 1.5 mm; Contact_surface: tinned; Insulating_material: LCP GF; UL_94_flammability_rating: V-0; Rated_voltage_for_surge_voltage_class_pollution_degree_II_2: 320 V; Rated_current_min_no_of_poles_TU_20_deg_C: 17.5 A; Rated_voltage_use_group_B_UL_1059: 300 V; Rated_current_use_group_B_UL_1059: 10 A; PackageReference: SCDV_THR_3_81_90F_06; Colour: Black; Packaging: Box; Qty: 50 PCS; Revision: V1; ComponentLink1Description: Manufacturer URL; ComponentLink1URL: http://www.weidmueller.com/; ComponentLink2Description: URL Link1; ComponentLink2URL: http://catalog.weidmueller.com/catalog/Start.do?localeId=en&ObjectID=1034320000
footprint SCDV_THR_3_81_90F_06 (OMNIMATE Signal - Serie BC/SC 3.81  SCDV-THR 3.81/06/90F 3.2)
part A pins: A1, A2, A3
part B pins: B1, B2, B3

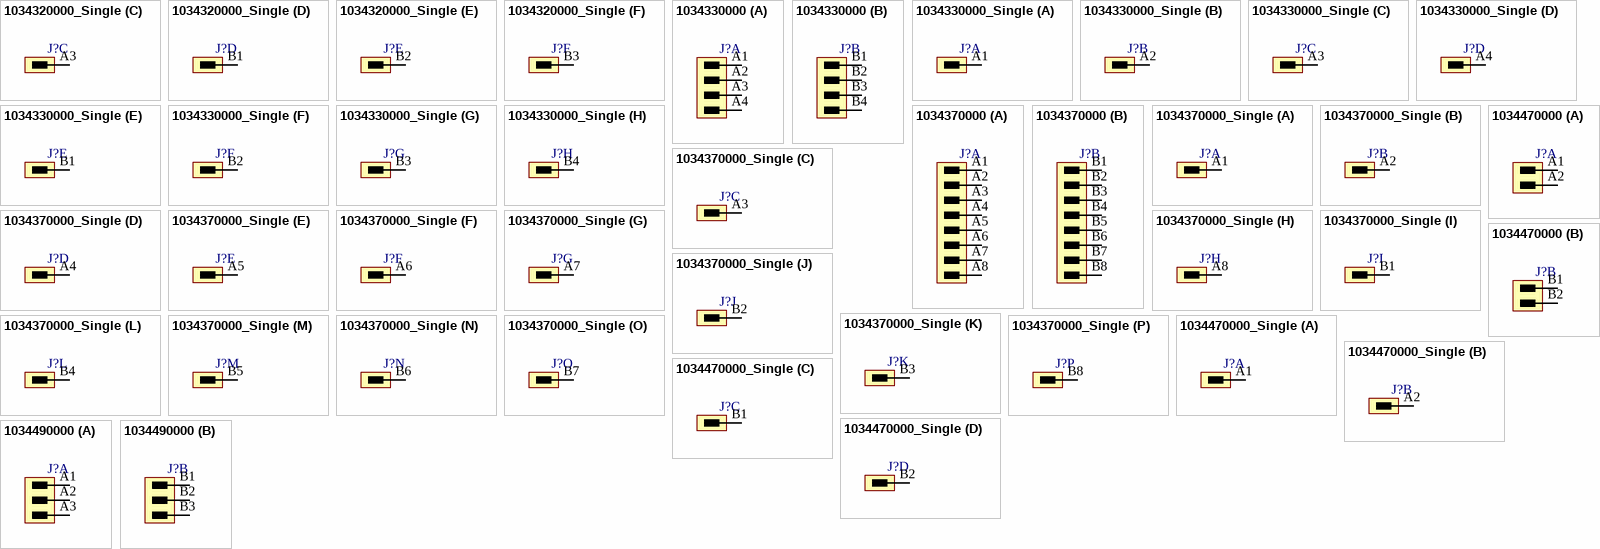
[diagram p19: symbols 1034320000_Single to 1034490000]

## 1034320000_Single
designator J?
OMNIMATE Signal - series BC/SC 3.81; PartNumber: 1034320000; Manufacturer: Weidmueller; Short_text_for_material: SCDV-THR 3.81/06/90F 1.5SN BK BX; Side_termination_characteristic: Flange; Mounting_onto_the_PCB: Reflow solder connection; Pitch_mm: 3.81 mm; Pitch_inch: 0.15 inch; No_of_poles: 6; Outgoing_elbow: 90°; Solder_pin_length_mm: 1.5 mm; Contact_surface: tinned; Insulating_material: LCP GF; UL_94_flammability_rating: V-0; Rated_voltage_for_surge_voltage_class_pollution_degree_II_2: 320 V; Rated_current_min_no_of_poles_TU_20_deg_C: 17.5 A; Rated_voltage_use_group_B_UL_1059: 300 V; Rated_current_use_group_B_UL_1059: 10 A; PackageReference: SCDV_THR_3_81_90F_06; Colour: Black; Packaging: Box; Qty: 50 PCS; Revision: V1; ComponentLink1Description: Manufacturer URL; ComponentLink1URL: http://www.weidmueller.com/; ComponentLink2Description: URL Link1; ComponentLink2URL: http://catalog.weidmueller.com/catalog/Start.do?localeId=en&ObjectID=1034320000
footprint SCDV_THR_3_81_90F_06 (OMNIMATE Signal - Serie BC/SC 3.81  SCDV-THR 3.81/06/90F 3.2)
part A pins: A1
part B pins: A2
part C pins: A3
part D pins: B1
part E pins: B2
part F pins: B3

## 1034330000
designator J?
OMNIMATE Signal - series BC/SC 3.81; PartNumber: 1034330000; Manufacturer: Weidmueller; Short_text_for_material: SCDV-THR 3.81/08/90F 1.5SN BK BX; Side_termination_characteristic: Flange; Mounting_onto_the_PCB: Reflow solder connection; Pitch_mm: 3.81 mm; Pitch_inch: 0.15 inch; No_of_poles: 8; Outgoing_elbow: 90°; Solder_pin_length_mm: 1.5 mm; Contact_surface: tinned; Insulating_material: LCP GF; UL_94_flammability_rating: V-0; Rated_voltage_for_surge_voltage_class_pollution_degree_II_2: 320 V; Rated_current_min_no_of_poles_TU_20_deg_C: 17.5 A; Rated_voltage_use_group_B_UL_1059: 300 V; Rated_current_use_group_B_UL_1059: 10 A; PackageReference: SCDV_THR_3_81_90F_08; Colour: Black; Packaging: Box; Qty: 50 PCS; Revision: V1; ComponentLink1Description: Manufacturer URL; ComponentLink1URL: http://www.weidmueller.com/; ComponentLink2Description: URL Link1; ComponentLink2URL: http://catalog.weidmueller.com/catalog/Start.do?localeId=en&ObjectID=1034330000
footprint SCDV_THR_3_81_90F_08 (OMNIMATE Signal - Serie BC/SC 3.81  SCDV-THR 3.81/08/90F 3.2)
part A pins: A1, A2, A3, A4
part B pins: B1, B2, B3, B4